# Altium footprint library IC_SMD_DUAL.PCBLIB: 179 footprints (part 12 of 12)
Each footprint in its own frame and in the unit in brackets; x right, y up, seen from the top. Pads: shape width x height; smd on the part's side, far side on the other; paste and mask are expansions set on the pad; w line width, h text height; cw(c..) or ccw(c..) is an arc to the next point about the centre after c.
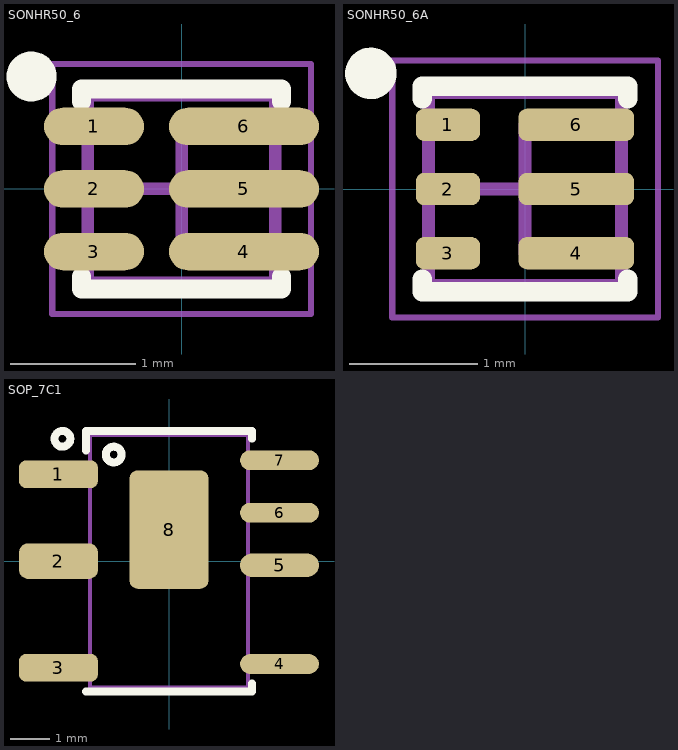
[diagram p11: the footprints below, top view; thin cyan lines are the x and y axes]

## SONHR50_6 [mm] "VSON-HR, 6, DMQ, 0.5mm pitch, 1.5x1.5mm"
height 1
pads (6):
  oval 0.8x0.3 smd mask+0.05: 1(-0.7,0.5) 2(-0.7,0) 3(-0.7,-0.5)
  oval 1.2x0.3 smd mask+0.05: 4(0.5,-0.5) 5(0.5,0) 6(0.5,0.5)
TopOverlay:
  circle w0.2: c-1.2,0.9 r0.1
  lines w0.15: -0.8,-0.7 -0.8,-0.8 0.8,-0.8 0.8,-0.7 ; -0.8,0.7 -0.8,0.8 0.8,0.8 0.8,0.7
Mechanical13:
  lines w0.1: -0.75,-0.75 -0.75,0.75 0.75,0.75 0.75,-0.75 -0.75,-0.75
Mechanical15:
  lines w0.05: -1.035,-1 -1.035,1 1.035,1 1.035,-1 -1.035,-1
  lines w0.1: -0.5,0 0.5,0 ; 0,-0.5 0,0.5
3D body "SONHR50_6.step": height 1, standoff 0, extent -0.751,-0.75 0.751,0.75

## SONHR50_6A [mm] "VSON-HR, 6, DMQ, 0.5mm pitch, 1.5x1.5mm"
height 1
pads (6):
  rrect50% 0.5x0.25 smd mask+0.05: 1(-0.6,0.5) 2(-0.6,0) 3(-0.6,-0.5)
  rrect50% 0.9x0.25 smd mask+0.05: 4(0.4,-0.5) 5(0.4,0) 6(0.4,0.5)
TopOverlay:
  circle w0.2: c-1.2,0.9 r0.1
  lines w0.15: -0.8,-0.7 -0.8,-0.8 0.8,-0.8 0.8,-0.7 ; -0.8,0.7 -0.8,0.8 0.8,0.8 0.8,0.7
Mechanical13:
  lines w0.1: -0.75,-0.75 0.75,-0.75 0.75,0.75 -0.75,0.75 -0.75,-0.75
Mechanical15:
  lines w0.05: -1.035,-1 1.035,-1 1.035,1 -1.035,1 -1.035,-1
  lines w0.1: -0.5,0 0.5,0 ; 0,-0.5 0,0.5
3D body "SONHR50_6.step": height 1, standoff 0, extent -0.751,-0.75 0.751,0.75

## SOP_7C1 [mm] "SOP-7 custom1 KP18001WPA"
height 1.8
pads (8):
  rrect50% 2x0.7 smd: 1(-2.8,2.2) 3(-2.8,-2.7)
  rrect50% 2x0.9 smd: 2(-2.8,0)
  oval 2x0.5 smd: 4(2.8,-2.605) 6(2.8,1.225) 7(2.8,2.555)
  oval 2x0.6 smd: 5(2.8,-0.105)
  rrect20% 2x3 smd: 8(0,0.8)
TopOverlay:
  circle w0.2: c-1.4,2.7 r0.2
  circle w0.2: c-2.7,3.1 r0.2
  lines w0.2: -2.1,-3.3 2.1,-3.3 2.1,-3.1 ; -2.1,2.8 -2.1,3.3 2.1,3.3 2.1,3.1
Mechanical13:
  lines w0.1: -2,-3.2 -2,3.2 2,3.2 2,-3.2 -2,-3.2
3D body: height 1.25, standoff 0, extent -2,-3.2 2,3.2